# Altium footprint library X98_CARRIER_V1R2_12082022.PcbLib: 104 footprints (part 1 of 7)
Each footprint in its own frame and in the unit in brackets; x right, y up, seen from the top. Pads: shape width x height; smd on the part's side, far side on the other; paste and mask are expansions set on the pad; w line width, h text height; cw(c..) or ccw(c..) is an arc to the next point about the centre after c.
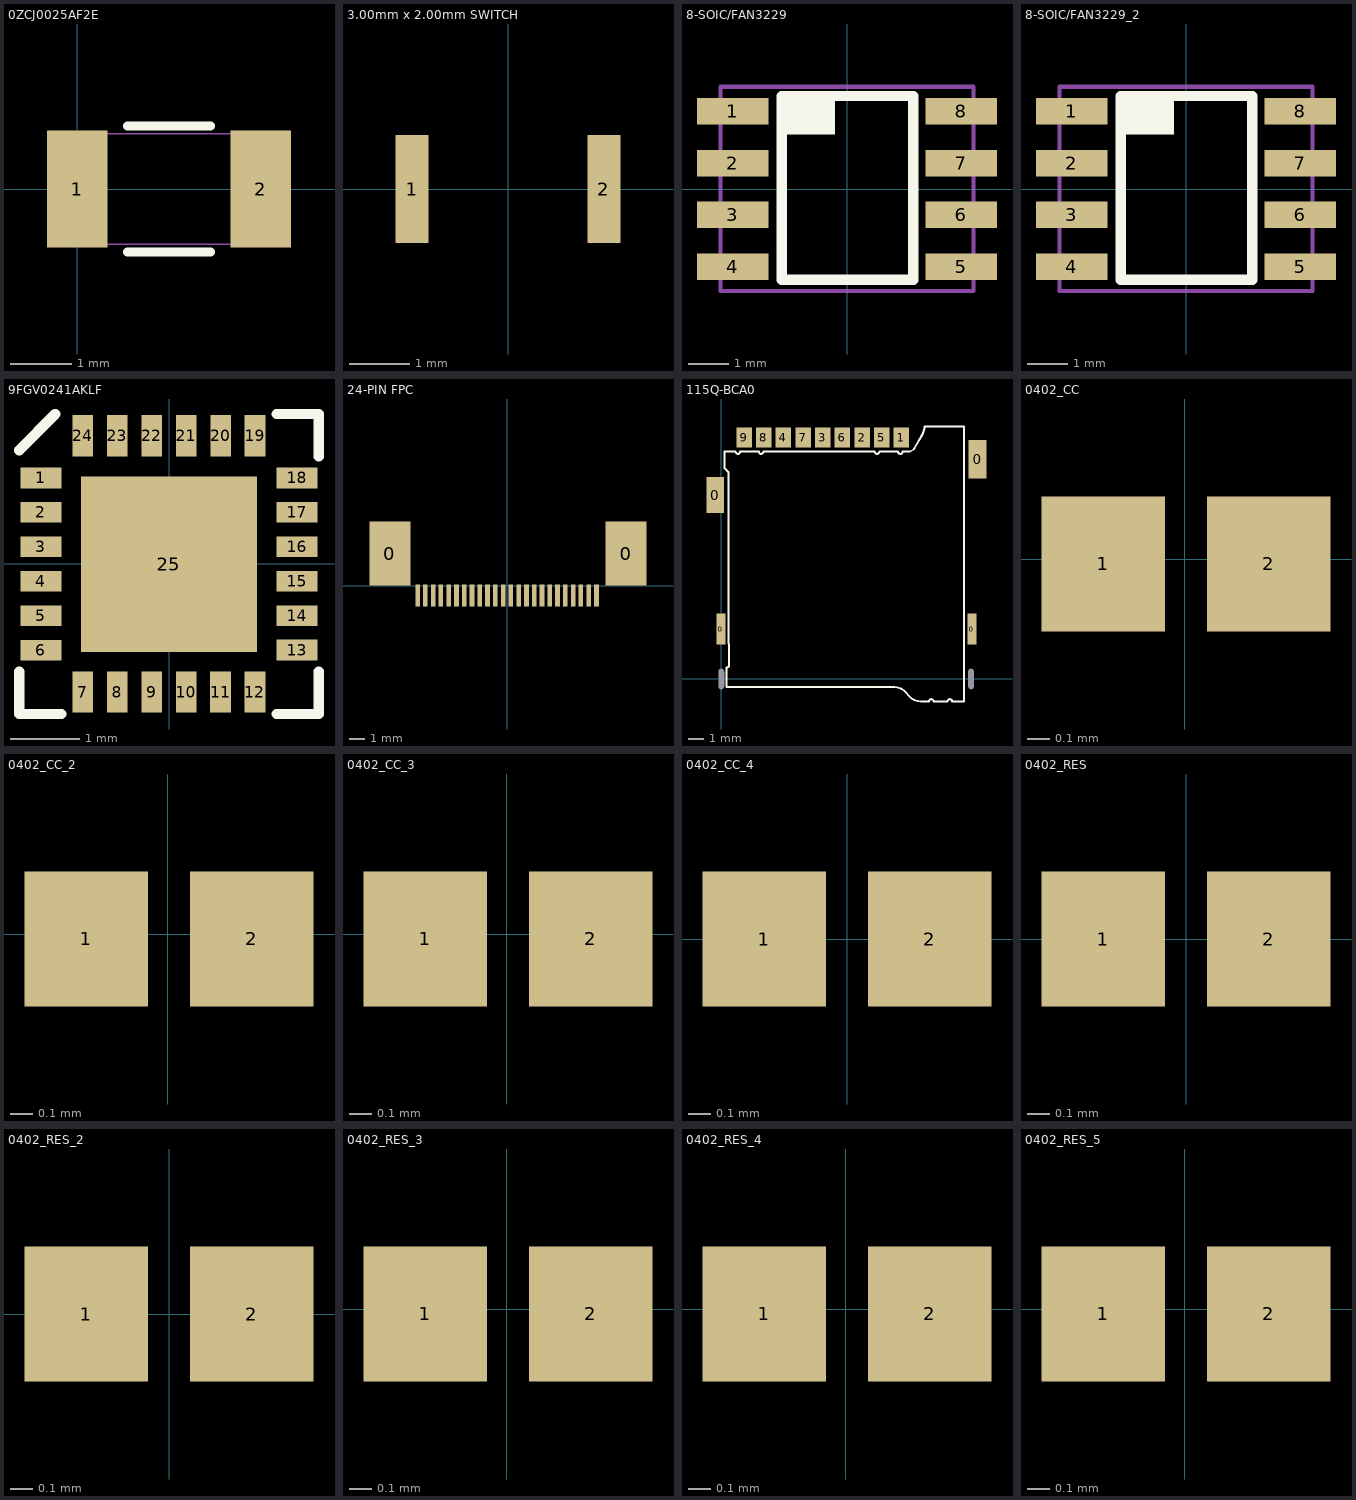
[diagram p0: the footprints below, top view; thin cyan lines are the x and y axes]

## 0ZCJ0025AF2E [mil] "PTC RESET FUSE 24V 250MA 1206"
pads (2):
  rect 39x75 smd paste+0 mask+1.97: 1(0,0) 2(118,0)
Top Overlay:
  lines w6: 32.25,-40.5 85.75,-40.5 ; 32.25,40.5 85.75,40.5
Mechanical 13:
  lines w1: -8.5,-35.5 -8.5,35.5 126.5,35.5 126.5,-35.5 -8.5,-35.5
3D body "0ZCJ_BEL.step": height 63.11, standoff -0.12, extent -7.48,-35.58 127.49,35.6

## 3.00mm x 2.00mm SWITCH [mm]
pads (2):
  rect 0.55x1.8 smd: 1(-1.6,0) 2(1.6,0)
3D body "c-2337230-1-a-3d.stp": height 0.55, standoff -0.05, extent -1.75,-1 1.75,1.08

## 8-SOIC/FAN3229 [mm]
pads (8):
  rect 1.75x0.65 smd: 1(-2.8,1.905) 2(-2.8,0.635) 3(-2.8,-0.635) 4(-2.8,-1.905) 5(2.8,-1.905) 6(2.8,-0.635) 7(2.8,0.635) 8(2.8,1.905)
Top Overlay:
  rectangle: -1.55,1.33 -0.3,2.205
  lines w0.254: -1.6,-2.22 1.625,-2.22 1.625,2.28 -1.6,2.28 -1.6,-2.22
Mechanical 1:
  lines w0.1: -3.1,-2.495 -3.1,2.505 3.1,2.505 3.1,-2.495 -3.1,-2.495
3D body "User Library-SOIC-8-1.STEP": height 1.75, standoff 0, extent -3,-2.445 3,2.455

## 8-SOIC/FAN3229_2 [mm]
pads (8):
  rect 1.75x0.65 smd: 1(-2.8,1.905) 2(-2.8,0.635) 3(-2.8,-0.635) 4(-2.8,-1.905) 5(2.8,-1.905) 6(2.8,-0.635) 7(2.8,0.635) 8(2.8,1.905)
Top Overlay:
  rectangle: -1.55,1.33 -0.3,2.205
  lines w0.254: -1.6,-2.22 -1.6,2.28 1.625,2.28 1.625,-2.22 -1.6,-2.22
Mechanical 1:
  lines w0.1: -3.1,-2.495 3.1,-2.495 3.1,2.505 -3.1,2.505 -3.1,-2.495
3D body "User Library-SOIC-8-1.STEP": height 1.75, standoff 0, extent -3,-2.445 3,2.455

## 9FGV0241AKLF [mm] "9FGV0241AKLF"
pads (25):
  rect 0.6x0.3 smd mask+0.05: 1(-1.86,1.249) 2(-1.86,0.749) 3(-1.86,0.249) 4(-1.86,-0.251) 5(-1.86,-0.751) 6(-1.86,-1.251) 13(1.86,-1.25) 14(1.86,-0.75) 15(1.86,-0.25) 16(1.86,0.25) 17(1.86,0.75) 18(1.86,1.25)
  rect 0.3x0.6 smd mask+0.05: 7(-1.251,-1.86) 8(-0.751,-1.86) 9(-0.251,-1.86) 10(0.249,-1.86) 11(0.749,-1.86) 12(1.249,-1.86) 19(1.249,1.861) 20(0.749,1.861) 21(0.249,1.861) 22(-0.251,1.861) 23(-0.751,1.861) 24(-1.251,1.861)
  rect 2.55x2.55 smd paste-2.55: 25(0,-0.001)
Top Overlay:
  lines w0.152: -2.178,-1.569 -2.178,-2.179 -1.567,-2.179 ; -2.178,1.654 -1.653,2.178 ; 1.566,2.178 2.177,2.178 2.177,1.568 ; 1.567,-2.179 2.178,-2.179 2.178,-1.569
Top Paste:
  region: 0.119,-0.119 0.119,-0.881 0.881,-0.881 0.881,-0.119
  region: -0.119,-0.119 -0.881,-0.119 -0.881,-0.881 -0.119,-0.881
  region: -0.119,0.119 -0.119,0.881 -0.881,0.881 -0.881,0.119
  rectangle: 0.119,0.119 0.881,0.881

## 24-PIN FPC [mm] "FPC/FFC 0.5MM SMT"
pads (26):
  rect 2.65x4.1 smd mask+0.051: 0(-7.532,2.075) 0(7.659,2.075)
  rect 0.3x1.4 smd mask+0.051: 1(-5.75,-0.624) 2(-5.25,-0.624) 3(-4.75,-0.624) 4(-4.25,-0.624) 5(-3.75,-0.624) 6(-3.25,-0.624) 7(-2.75,-0.624) 8(-2.25,-0.624) 9(-1.75,-0.624) 10(-1.25,-0.624) 11(-0.75,-0.624) 12(-0.25,-0.624) 13(0.25,-0.624) 14(0.75,-0.624) 15(1.25,-0.624) 16(1.75,-0.624) 17(2.25,-0.624) 18(2.75,-0.624) 19(3.25,-0.624) 20(3.75,-0.624) 21(4.25,-0.624) 22(4.75,-0.624) 23(5.25,-0.624) 24(5.75,-0.624)
3D body "24 pin ffc.stp": height 2.02, standoff -0.02, extent -8.75,-1.26 8.75,4.14

## 115Q-BCA0 [mm]
pads (15):
  rect 1.15x2.35 smd mask+0.051: 0(-0.394,11.875)
  rect 0.6x2 smd mask+0.051: 0(-0.023,3.226) 0(16.178,3.226)
  round 0 hole 0.35 slot 1.3 at 90 deg: 0(0,0) 0(16.129,0)
  rect 1.15x2.5 smd mask+0.051: 0(16.548,14.186)
  rect 1x1.3 smd mask+0.051: 1(11.627,15.583) 2(9.087,15.583) 3(6.547,15.583) 4(4.007,15.583) 5(10.357,15.583) 6(7.817,15.583) 7(5.277,15.583) 8(2.737,15.583) 9(1.467,15.583)
Top Overlay:
  lines w0.127: 0.212,14.181 0.212,14.681 0.922,14.681 0.926,14.648 0.937,14.616 0.955,14.588 0.979,14.564 1.007,14.546 1.039,14.535 1.072,14.531 1.105,14.535 1.137,14.546 1.166,14.564 1.189,14.588 1.207,14.616 1.218,14.648 1.222,14.681 2.422,14.681 2.426,14.648 2.437,14.616 2.455,14.588 2.479,14.564 2.507,14.546 2.539,14.535 2.572,14.531 2.605,14.535 2.637,14.546 2.666,14.564 2.689,14.588 2.707,14.616 2.718,14.648 2.722,14.681 9.907,14.681 9.911,14.648 9.922,14.616 9.94,14.588 9.964,14.564 9.992,14.546 10.024,14.535 10.057,14.531 10.09,14.535 10.122,14.546 10.151,14.564 10.174,14.588 10.192,14.616 10.203,14.648 10.207,14.681 11.407,14.681 11.411,14.648 11.422,14.616 11.44,14.588 11.464,14.564 11.492,14.546 11.524,14.535 11.557,14.531 11.59,14.535 11.622,14.546 11.651,14.564 11.674,14.588 11.692,14.616 11.703,14.648 11.707,14.681 12.057,14.681 12.172,14.695 12.281,14.734 12.378,14.798 12.458,14.883 ; 0.212,14.498 0.212,13.598 0.432,13.378 ; 0.453,2.328 0.453,13.364 ; 0.456,2.31 0.479,2.287 0.497,2.258 0.508,2.226 0.512,2.193 0.512,0.893 0.508,0.86 0.497,0.828 0.479,0.8 0.456,0.776 0.427,0.758 0.395,0.747 0.362,0.743 0.339,0.743 0.339,-0.527 11.17,-0.527 11.386,-0.551 11.592,-0.621 11.778,-0.734 11.936,-0.884 12.112,-1.095 12.27,-1.245 12.456,-1.358 12.662,-1.428 12.878,-1.452 13.407,-1.452 13.41,-1.421 13.42,-1.391 13.436,-1.364 13.457,-1.34 13.482,-1.322 13.511,-1.309 13.541,-1.303 13.573,-1.303 13.603,-1.309 13.632,-1.322 13.657,-1.34 13.678,-1.364 13.694,-1.391 13.704,-1.421 13.707,-1.452 14.607,-1.452 14.61,-1.421 14.62,-1.391 14.636,-1.364 14.657,-1.34 14.682,-1.322 14.711,-1.309 14.741,-1.303 14.773,-1.303 14.803,-1.309 14.832,-1.322 14.857,-1.34 14.878,-1.364 14.894,-1.391 14.904,-1.421 14.907,-1.452 15.673,-1.452 15.673,2.168 15.673,11.218 15.673,16.298 ; 12.458,14.883 12.994,15.792 13.116,16.158 13.127,16.264 13.127,16.298 13.777,16.298 15.672,16.298
3D body "115Q-BCA0_C_1.step": height 1.83, standoff -0.53, extent -0.588,-1.443 16.702,16.632

## 0402_CC [mil]
pads (2):
  rect 22x24 smd mask+2: 1(-14.54,-0.81) 2(14.98,-0.81)
3D body "CAPC1005X55N(0402).STEP": height 20.67, standoff -0.98, extent -19.69,-10 19.68,9.68

## 0402_CC_2 [mil]
pads (2):
  rect 22x24 smd mask+2: 1(-14.54,-0.81) 2(14.98,-0.81)
3D body "CAPC1005X55N(0402).STEP": height 20.67, standoff -0.98, extent -19.69,-10 19.68,9.68

## 0402_CC_3 [mil]
pads (2):
  rect 22x24 smd mask+2: 1(-14.54,-0.81) 2(14.98,-0.81)
3D body "CAPC1005X55N(0402).STEP": height 20.67, standoff -0.98, extent -19.69,-10 19.68,9.68

## 0402_CC_4 [mil]
pads (2):
  rect 22x24 smd mask+2: 1(-14.76,0) 2(14.76,0)
3D body "CAPC1005X55N(0402).STEP": height 20.67, standoff -0.98, extent -19.69,-10 19.68,9.68

## 0402_RES [mil]
pads (2):
  rect 22x24 smd mask+2: 1(-14.76,0) 2(14.76,0)
3D body "User Library-User Library-RES0402-2.STEP": height 13.78, standoff 0, extent -19.68,-9.84 19.69,9.85

## 0402_RES_2 [mil]
pads (2):
  rect 22x24 smd mask+2: 1(-14.76,0) 2(14.76,0)
3D body "User Library-User Library-RES0402-2.STEP": height 13.78, standoff 0, extent -19.68,-9.84 19.69,9.85

## 0402_RES_3 [mil]
pads (2):
  rect 22x24 smd mask+2: 1(-14.54,-0.81) 2(14.98,-0.81)
3D body "User Library-User Library-RES0402-2.STEP": height 13.78, standoff 0, extent -19,-11 20.37,8.69

## 0402_RES_4 [mil]
pads (2):
  rect 22x24 smd mask+2: 1(-14.54,-0.81) 2(14.98,-0.81)
3D body "User Library-User Library-RES0402-2.STEP": height 13.78, standoff 0, extent -19,-11 20.37,8.69

## 0402_RES_5 [mil]
pads (2):
  rect 22x24 smd mask+2: 1(-14.54,-0.81) 2(14.98,-0.81)
3D body "User Library-User Library-RES0402-2.STEP": height 13.78, standoff 0, extent -19,-11 20.37,8.69